# Altium footprint library boxer_pas.PcbLib: 70 footprints (part 1 of 5)
Each footprint in its own frame and in the unit in brackets; x right, y up, seen from the top. Pads: shape width x height; smd on the part's side, far side on the other; paste and mask are expansions set on the pad; w line width, h text height; cw(c..) or ccw(c..) is an arc to the next point about the centre after c.
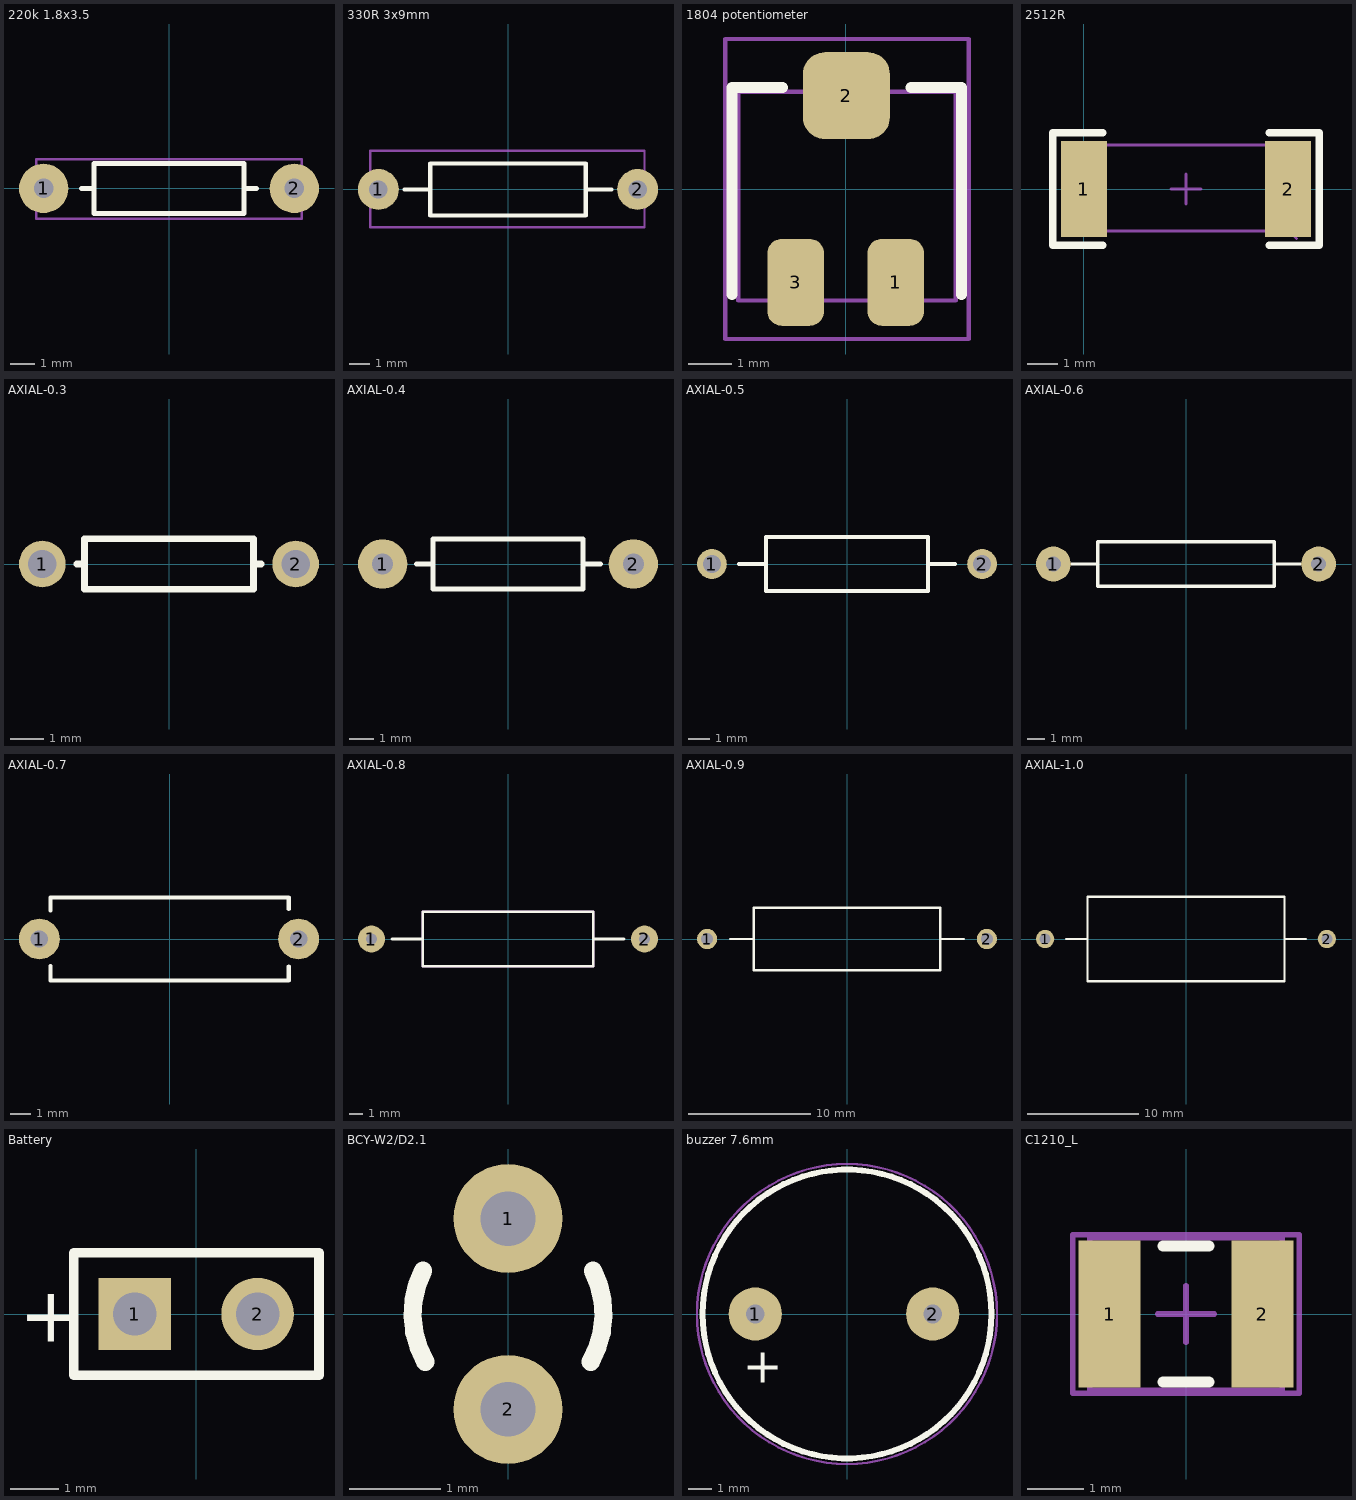
[diagram p0: the footprints below, top view; thin cyan lines are the x and y axes]

## 220k 1.8x3.5 [mm] "Axial Device, Thru-Hole; 2 Leads; 0.4 in Pin Spacing"
height 2.032
pads (2):
  round 2 hole 0.8: 1(-5.08,0) 2(5.08,0)
Top Overlay:
  lines w0.2: -3.556,0 -3.048,0 ; 3.048,0 3.556,0 ; -3.048,-1.016 -3.048,1.016 3.048,1.016 3.048,-1.016 -3.048,-1.016
Mechanical 13:
  lines w0.1: -5.38,-1.225 -5.38,1.175 5.38,1.175 5.38,-1.225 -5.38,-1.225
  text ".Designator" at -3.297,1.489 h0.5
  text ".Value" at -0.991,-0.178 h0.5
3D body "User Library-Res40-Axial 0_25W-220K.step": height 2.41, standoff -2, extent -5.38,-1.225 5.38,1.175

## 330R 3x9mm [mm] "3x9mm"
height 5
pads (2):
  round 2 hole 0.9: 1(-6.35,0) 2(6.35,0)
Top Overlay:
  lines w0.2: -5.08,0 -3.81,0 ; 3.81,0 5.08,0 ; -3.81,-1.27 -3.81,1.27 3.81,1.27 3.81,-1.27 -3.81,-1.27
Mechanical 13:
  lines w0.1: -6.75,-1.852 -6.75,1.898 6.7,1.898 6.7,-1.852 -6.75,-1.852
  text ".Designator" at -6.777,2.2 h0.5
  text ".Value" at -1.041,-0.178 h0.5
3D body "User Library-Res50-Axial 0_5W-330R.step": height 4.38, standoff -5, extent -6.75,-1.852 6.7,1.898

## 1804 potentiometer [mm]
height 2.7
pads (3):
  rrect50% 1.3x2 smd: 1(1.15,-2.146) 3(-1.15,-2.146)
  rrect50% 2x2 smd: 2(0.018,2.146)
Top Overlay:
  lines w0.254: -2.616,-2.426 -2.616,2.337 -1.448,2.337 ; 1.499,2.337 2.667,2.337 2.667,-2.426
Mechanical 13:
  lines w0.1: -2.469,-2.565 -2.469,2.235 2.531,2.235 2.531,-2.565 -2.469,-2.565
  text ".Designator" at -1.626,3.658 h0.5
  text ".Value" at -0.965,-0.229 h0.5
Mechanical 15:
  lines w0.1: -2.769,-3.45 2.831,-3.45 2.831,3.45 -2.769,3.45 -2.769,-3.45
3D body "User Library-ST-4EA.step": height 2.3, standoff -0.03, extent -2.469,-2.565 2.531,2.235

## 2512R [mm]
pads (2):
  rect 1.524x3.2 smd: 1(0,0) 2(6.8,0)
Top Overlay:
  lines w0.254: 0.622,-1.88 -1.041,-1.88 -1.041,1.88 0.622,1.88 ; 6.178,-1.88 7.842,-1.88 7.842,1.88 6.178,1.88
Mechanical 13:
  lines w0.1: 6.826,-0.7 6.826,0.7 ; 6.833,1.473 0,1.473 0,-1.397 6.833,-1.397 7.087,-1.651
  text ".Designator" at 1.774,1.832 h0.5
  text ".Value" at 2.502,-0.216 h0.5
Mechanical 15:
  lines w0.1: 2.904,0 3.904,0 ; 3.404,-0.5 3.404,0.5
3D body: height 0.7, standoff 0, extent 0.025,-1.397 6.807,1.473

## AXIAL-0.3 [mm] "Axial Device, Thru-Hole; 2 Leads; 0.3 in Pin Spacing"
height 1.524
pads (2):
  round 1.4 hole 0.85: 1(-3.81,0) 2(3.81,0)
Top Overlay:
  lines w0.2: -2.769,0 -2.54,0 ; 2.769,0 2.54,0 ; 2.54,0 2.54,0.762 -2.54,0.762 -2.54,-0.762 2.54,-0.762 2.54,0

## AXIAL-0.4 [mm] "Axial Device, Thru-Hole; 2 Leads; 0.4 in Pin Spacing"
height 2.032
pads (2):
  round 2 hole 0.85: 1(-5.08,0) 2(5.08,0)
Top Overlay:
  lines w0.2: -3.708,0 -3.048,0 ; 3.048,0 3.759,0 ; -3.048,-1.016 -3.048,1.016 3.048,1.016 3.048,-1.016 -3.048,-1.016

## AXIAL-0.5 [mm] "3x9mm"
height 5
pads (2):
  round 1.4 hole 0.85: 1(-6.35,0) 2(6.35,0)
Top Overlay:
  lines w0.2: -5.08,0 -3.81,0 ; 3.81,0 5.08,0 ; -3.81,-1.27 -3.81,1.27 3.81,1.27 3.81,-1.27 -3.81,-1.27
3D body "User Library-Res50-Axial 0_5W-330R.step": height 4.38, standoff -5, extent -6.75,-1.852 6.7,1.898

## AXIAL-0.6 [mm] "Axial Device, Thru-Hole; 2 Leads; 0.6 in Pin Spacing"
height 2.54
pads (2):
  round 2 hole 0.85: 1(-7.62,0) 2(7.62,0)
Top Overlay:
  lines w0.2: -6.604,0 -5.08,0 ; 5.08,0 6.604,0 ; -5.08,-1.27 -5.08,1.27 5.08,1.27 5.08,-1.27 -5.08,-1.27

## AXIAL-0.7 [mm] "Axial Device, Thru-Hole; 2 Leads; 0.7 in Pin Spacing"
height 4.064
pads (2):
  round 2 hole 0.85: 1(-6.375,0) 2(6.325,0)
Top Overlay:
  lines w0.2: -5.842,-1.321 -5.842,-2.032 5.842,-2.032 5.842,-1.346 ; -5.842,1.397 -5.842,2.032 5.842,2.032 5.842,1.473

## AXIAL-0.8 [mm] "Axial Device, Thru-Hole; 2 Leads; 0.8 in Pin Spacing"
height 4.064
pads (2):
  round 2 hole 0.8: 1(-10.16,0) 2(10.16,0)
Top Overlay:
  lines w0.2: -8.636,0 -6.35,0 ; 6.35,0 8.636,0 ; -6.35,-2.032 -6.35,2.032 6.35,2.032 6.35,-2.032 -6.35,-2.032
Mechanical 13:
  lines w0.2: -6.35,-2.032 6.35,-2.032 6.35,2.032 -6.35,2.032 -6.35,-2.032
  text ".Value" at -0.914,-0.203 h0.5
  text ".Designator" at -6.32,2.454 h0.5

## AXIAL-0.9 [mm] "Axial Device, Thru-Hole; 2 Leads; 0.9 in Pin Spacing"
height 5.08
pads (2):
  round 1.65 hole 1: 1(-11.43,0) 2(11.43,0)
Top Overlay:
  lines w0.2: -9.525,0 -7.62,0 ; 7.62,0 9.525,0 ; -7.62,-2.54 7.62,-2.54 7.62,2.54 -7.62,2.54 -7.62,-2.54

## AXIAL-1.0 [mm] "Axial Device, Thru-Hole; 2 Leads; 1.0 in Pin Spacing"
height 7.62
pads (2):
  round 1.65 hole 1: 1(-12.7,0) 2(12.7,0)
Top Overlay:
  lines w0.2: -10.795,0 -8.89,0 ; 8.89,0 10.795,0 ; -8.89,-3.81 8.89,-3.81 8.89,3.81 -8.89,3.81 -8.89,-3.81

## Battery [mm]
pads (2):
  rect 1.5x1.5 hole 0.9: 1(-1.27,0)
  round 1.5 hole 0.9: 2(1.27,0)
Top Overlay:
  lines w0.2: -2.54,-1.27 2.54,-1.27 2.54,1.27 -2.54,1.27 -2.54,-1.27
  text "+" at -3.67,-0.577 h1.15

## BCY-W2/D2.1 [mm] "Crystal, Thru-Hole; 2 Leads; Body 2.1 x 6.2 mm (Dia.xH)"
height 6.2
pads (2):
  round 1.2 hole 0.6: 1(0,1.05) 2(0,-1.05)
Top Overlay:
  lines w0.2: -0.936,0.477 ccw(c0,0) -0.909,-0.525 ; 0.909,-0.525 ccw(c0,0) 0.936,0.477

## buzzer 7.6mm [mil]
pads (2):
  round 90 hole 31.5: 1(-155,0) 2(145,0)
Top Overlay:
  circle w10: c0,0 r244.09
  text "+" at -176,-116 h59.06
Mechanical 13:
  circle w3.94: c0,0 r253.5
  text ".Designator" at -234.91,244.8 h19.68
  text ".Value" at -37,-8 h19.68
Mechanical 15:
  circle w3.94: c0,0 r253.5
3D body "cem-1205c.stp": height 374.02, standoff -177.17, extent -236.21,-237.22 236.23,235.23

## C1210_L [mm] "Chip Capacitor, Body 3.2x2.5mm, IPC High Density"
height 1.5
pads (2):
  rect 1.1x2.6 smd: 1(-1.35,0) 2(1.35,0)
Top Overlay:
  lines w0.2: -0.4,-1.2 0.4,-1.2 ; -0.4,1.2 0.4,1.2
Mechanical 13:
  lines w0.1: -1.7,-1.35 -1.7,1.35 1.7,1.35 1.7,-1.35 -1.7,-1.35
Mechanical 15:
  lines w0.1: -0.5,0 0.5,0 ; 0,-0.5 0,0.5 ; -2,-1.4 -2,1.4 2,1.4 2,-1.4 -2,-1.4
3D body: height 1.5, standoff 0, extent -1.7,-1.35 1.7,1.35